# Altium footprint library common_pcblib.PcbLib: 54 footprints (part 3 of 4)
Each footprint in its own frame and in the unit in brackets; x right, y up, seen from the top. Pads: shape width x height; smd on the part's side, far side on the other; paste and mask are expansions set on the pad; w line width, h text height; cw(c..) or ccw(c..) is an arc to the next point about the centre after c.
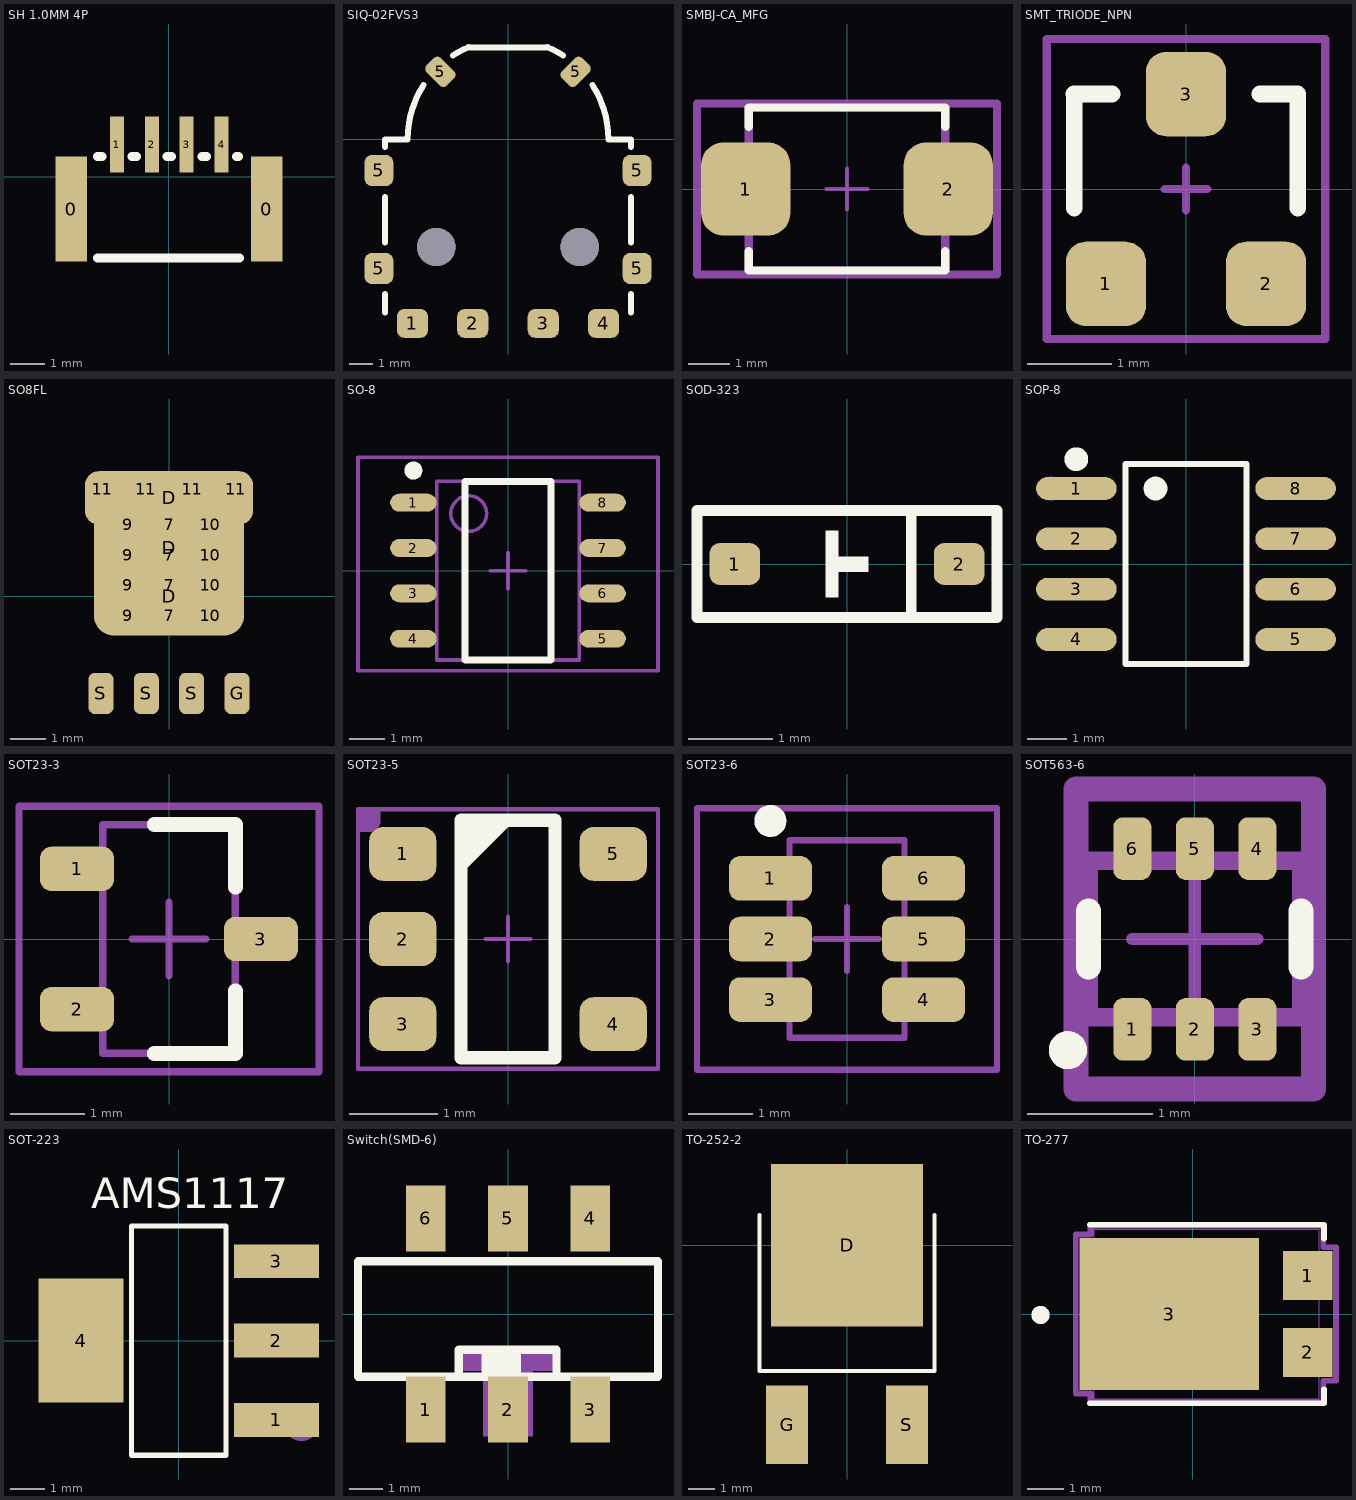
[diagram p2: the footprints below, top view; thin cyan lines are the x and y axes]

## SH 1.0MM 4P [mm] "4P立贴"
pads (6):
  rect 0.9x3 smd: 0(-2.8,-0.924) 0(2.8,-0.924)
  rect 0.4x1.6 smd: 1(-1.493,0.924) 2(-0.493,0.924) 3(0.507,0.924) 4(1.507,0.924)
Top Overlay:
  lines w0.254: -2.05,-2.324 2.03,-2.324 ; -2.05,0.586 -1.924,0.586 ; -1.062,0.586 -0.924,0.586 ; -0.062,0.586 0.076,0.586 ; 0.938,0.586 1.076,0.586 ; 1.938,0.586 2,0.586
3D body "User Library-插座1.0mm 4P.step": height 4.25, standoff 0, extent -3,-2.413 3,1.187

## SIQ-02FVS3 [mm]
pads (10):
  rrect50% 1.3x1.2 smd: 1(-4,-7.7) 2(-1.475,-7.7) 3(1.475,-7.7) 4(4,-7.7)
  rrect50% 1.2x1.3 smd: 5(-5.4,-5.4) 5(-5.4,-1.3) 5(5.4,-5.4) 5(5.4,-1.3)
  rrect50% 0.85x1.2 smd rot 45: 5(-2.828,2.828)
  rrect50% 0.85x1.2 smd rot 135: 5(2.828,2.828)
via 3,-4.5 diameter 1.6 hole 1.6
via -3,-4.5 diameter 1.6 hole 1.6
Top Overlay:
  lines w0.254: -5.15,-7.25 -5.15,-6.477 ; -5.15,-4.318 -5.15,-2.402 ; -5.15,-0.324 -5.15,0 -4.2,0 cw(c0,0) -3.533,2.271 ; -2.298,3.515 cw(c0,0) -1.655,3.86 ; -1.655,3.85 1.655,3.85 ; 1.655,3.86 cw(c0,0) 2.298,3.515 ; 3.533,2.271 cw(c0,0) 4.2,0 5.15,0 5.15,-0.324 ; 5.15,-7.25 5.15,-6.477 ; 5.15,-4.318 5.15,-2.402
3D body "RE.step": height 4.06, standoff -0.44, extent -7.199,-7.5 7.199,7.25

## SMBJ-CA_MFG [mm]
pads (2):
  rrect50% 2.16x2.26 smd paste+0 mask+0: 1(-2.45,0) 2(2.45,0)
Top Overlay:
  lines w0.2: -2.375,-1.505 -2.375,-1.97 2.375,-1.97 2.375,-1.505 ; -2.375,1.505 -2.375,1.97 2.375,1.97 2.375,1.505
Mechanical 10:
  lines w0.2: -3.63,-2.07 -3.63,2.07 3.63,2.07 3.63,-2.07 -3.63,-2.07
Mechanical 12:
  lines w0.2: -2.375,-1.97 -2.375,1.97 2.375,1.97 2.375,-1.97 -2.375,-1.97
Mechanical 15:
  lines w0.1: -0.5,0 0.5,0 ; 0,-0.5 0,0.5
  lines w0.2: -3.63,-2.07 -3.63,2.07 3.63,2.07 3.63,-2.07 -3.63,-2.07
3D body "Diode_Littelfuse_Inc_SMBJ28CA_eec.STEP": height 2.62, standoff 0, extent -2.7,-1.81 2.7,1.81

## SMT_TRIODE_NPN [mm]
pads (3):
  rrect50% 0.95x1 smd: 1(-0.95,-1.125) 2(0.95,-1.125) 3(0,1.125)
Top Overlay:
  lines w0.2: -1.328,1.125 -0.875,1.125 ; -1.325,-0.225 -1.325,1.125 ; 0.875,1.125 1.325,1.125 1.325,-0.225
Mechanical 15:
  lines w0.1: -0.254,0 0.254,0 ; 0,-0.254 0,0.254 ; -1.651,-1.778 1.651,-1.778 1.651,1.778 -1.651,1.778 -1.651,-1.778
3D body "User Library-SOT23-3.step": height 1.3, standoff 0, extent -1.448,-1.397 1.452,1.403

## SO8FL [mm]
pads (23):
  rect 0.9x0.6 on Top Paste: 7(0,-0.55) 7(0,0.3) 7(0,1.15) 7(0,2) 9(-1.15,-0.55) 9(-1.15,0.3) 9(-1.15,1.15) 9(-1.15,2) 10(1.15,-0.55) 10(1.15,0.3) 10(1.15,1.15) 10(1.15,2)
  rect 0.6x0.9 on Top Paste: 11(-1.875,3) 11(-0.65,3) 11(0.65,3) 11(1.875,3)
  rrect50% 4.2x2.2 smd paste-10 mask+0.075: D(0,0)
  rect 4.2x2.2 smd paste-10 mask+0.075: D(0,1.35)
  rrect50% 4.7x1.5 smd paste-10 mask+0.075: D(0,2.75)
  rrect50% 0.7x1.15 smd paste-0.05 mask+0.075: G(1.905,-2.725) S(-1.905,-2.725) S(-0.635,-2.725) S(0.635,-2.725)
3D body "User Library-DFN5x6_SO8FL.STEP": height 1.13, standoff 0, extent -2.575,-2.95 2.575,3.2

## SO-8 [mm]
pads (8):
  oval 1.3x0.5 smd: 1(-2.65,1.905) 2(-2.65,0.635) 3(-2.65,-0.635) 4(-2.65,-1.905) 5(2.65,-1.905) 6(2.65,-0.635) 7(2.65,0.635) 8(2.65,1.905)
Top Overlay:
  circle w0.25: c-2.65,2.805 r0.125
  lines w0.2: -1.2,-2.5 -1.2,2.5 1.2,2.5 1.2,-2.5 -1.2,-2.5
Mechanical 13:
  circle w0.1: c-1.1,1.6 r0.5
  lines w0.1: -2,-2.5 -2,2.5 2,2.5 2,-2.5 -2,-2.5
Mechanical 15:
  lines w0.1: -0.5,0 0.5,0 ; 0,-0.5 0,0.5 ; -4.2,-2.8 -4.2,3.175 4.2,3.175 4.2,-2.8 -4.2,-2.8
3D body "SW3DPS-SO-8-DEFAULT.STEP": height 1.45, standoff 0, extent -2.889,-2.439 2.889,2.464

## SOD-323 [mm]
pads (2):
  rrect50% 0.6x0.5 smd: 1(-1.329,0) 2(1.329,0)
Top Overlay:
  region: -0.254,0.394 -0.102,0.394 -0.102,0.089 0.254,0.089 0.254,-0.089 -0.102,-0.089 -0.102,-0.394 -0.254,-0.394
  lines w0.127: 0.762,-0.635 0.762,0.635 ; -1.778,-0.635 1.778,-0.635 1.778,0.635 -1.778,0.635 -1.778,-0.635
3D body "SW3dPS-SOD-323.STEP": height 1.15, standoff 0.05, extent -1.3,-0.675 1.3,0.675

## SOP-8 [mm]
pads (8):
  oval 2.036x0.574 smd: 1(-2.768,1.905) 2(-2.768,0.635) 3(-2.768,-0.635) 4(-2.768,-1.905) 5(2.768,-1.905) 6(2.768,-0.635) 7(2.768,0.635) 8(2.768,1.905)
Top Overlay:
  circle w0.3: c-2.768,2.644 r0.15
  circle w0.3: c-0.769,1.905 r0.15
  lines w0.152: -1.521,-2.526 -1.521,2.526 1.521,2.526 1.521,-2.526 -1.521,-2.526
Mechanical 15:
  circle w0.3: c-3.398,1.905 r0.15
3D body "User Library-HSOP8-1.STEP": height 1.74, standoff -0.01, extent -3.1,-2.54 3.1,2.46

## SOT23-3 [mm]
pads (3):
  rrect50% 1x0.6 smd: 1(-1.246,0.95) 2(-1.246,-0.95) 3(1.246,0)
Top Overlay:
  lines w0.2: -0.2,-1.55 0.9,-1.55 0.9,-0.7 ; -0.2,1.55 0.9,1.55 0.9,0.7
Mechanical 13:
  lines w0.1: -0.9,-1.55 0.9,-1.55 0.9,1.55 -0.9,1.55 -0.9,-1.55
Mechanical 15:
  lines w0.1: -0.5,0 0.5,0 ; 0,-0.5 0,0.5 ; -2.032,-1.8 2.032,-1.8 2.032,1.8 -2.032,1.8 -2.032,-1.8
3D body "SOT-23-3.stp": height 1.2, standoff 0, extent -1.298,-1.45 1.502,1.45

## SOT23-5 [mil]
pads (5):
  rrect50% 30x24 smd: 1(-47,38) 2(-47,0) 3(-47,-38) 4(47,-38) 5(47,38)
Top Overlay:
  region: -21,53 3,53 -21,29
  lines w6: -21,-53 -21,53 21,53 21,-53 -21,-53
Mechanical 13:
  lines w2: -10,0 10,0 ; 0,-10 0,10
Mechanical 14:
  region: -67,58 -57,58 -57,53 -57,52.01 -57.76,50.17 -59.17,48.76 -61.01,48 -62,48 -67,48
  lines w2: -67,-58 67,-58 67,58 -67,58 -67,-58
3D body "User Library-SOT23-5-2.STEP": height 57.09, standoff 0, extent -55.11,-57.08 55.12,57.09

## SOT23-6 [mm]
pads (6):
  rrect50% 1.3x0.7 smd: 1(-1.2,0.95) 2(-1.2,0) 3(-1.2,-0.95) 4(1.2,-0.95) 5(1.2,0) 6(1.2,0.95)
Top Overlay:
  circle w0.25: c-1.2,1.85 r0.125
Mechanical 13:
  lines w0.1: -0.9,-1.55 0.9,-1.55 0.9,1.55 -0.9,1.55 -0.9,-1.55
Mechanical 15:
  lines w0.1: -0.5,0 0.5,0 ; 0,-0.5 0,0.5 ; -2.35,-2.05 2.35,-2.05 2.35,2.05 -2.35,2.05 -2.35,-2.05
3D body "User Library-SOT23-6-2.step": height 1.45, standoff 0, extent -1.4,-1.45 1.4,1.45

## SOT563-6 [mm]
pads (6):
  rrect50% 0.305x0.5 smd paste+0 mask+0: 1(-0.5,-0.723) 2(0,-0.723) 3(0.5,-0.723) 4(0.5,0.723) 5(0,0.723) 6(-0.5,0.723)
Top Overlay:
  circle w0.152: c-1.016,-0.889 r0.076
  lines w0.2: -0.85,-0.225 -0.85,0.225 ; 0.85,-0.225 0.85,0.225
Mechanical 10:
  lines w0.2: -0.95,-1.2 0.95,-1.2 0.95,1.2 -0.95,1.2 -0.95,-1.2
Mechanical 12:
  lines w0.15: -0.85,-0.625 0.85,-0.625 0.85,0.625 -0.85,0.625 -0.85,-0.625
Mechanical 15:
  lines w0.1: -0.5,0 0.5,0 ; 0,-0.5 0,0.5
  lines w0.2: -0.95,-1.2 0.95,-1.2 0.95,1.2 -0.95,1.2 -0.95,-1.2
3D body "Trans_Diodes_BC847BVC-7_eec.STEP": height 0.6, standoff 0, extent -0.8,-0.8 0.8,0.8

## SOT-223 [mm] "AMS1117"
pads (4):
  rect 2.47x0.98 smd: 1(2.835,-2.3) 2(2.835,0) 3(2.835,2.3)
  rect 2.47x3.6 smd: 4(-2.835,0)
Top Overlay:
  lines w0.152: -1.371,-3.326 -1.371,3.326 1.371,3.326 1.371,-3.326 -1.371,-3.326
  text "AMS1117" at -2.54,3.556 h1.52
Mechanical 15:
  circle w0.5: c3.556,-2.413 r0.25
3D body "lm7805mpx_nopb.stp": height 1.66, standoff 0, extent -3.5,-3.302 3.5,3.198

## Switch(SMD-6) [mm]
pads (6):
  rect 1.2x2 smd: 1(-2.5,-2.9) 2(0,-2.9) 3(2.5,-2.9) 4(2.5,2.9) 5(0,2.9) 6(-2.5,2.9)
Top Overlay:
  lines w0.254: -0.67,-1.795 -0.67,-1.1 -0.64,-1.1 ; -0.06,-1.58 -0.06,-1.6 -0.41,-1.6 -0.41,-1.46 -0.39,-1.46 -0.39,-1.44 0.09,-1.44 0.09,-1.72 0.13,-1.72 -0.51,-1.72 -0.51,-1.24 -0.49,-1.24 -0.49,-1.23 0.26,-1.23 0.26,-1.78 ; -4.55,-1.9 4.55,-1.9 4.55,1.6 -4.55,1.6 -4.55,-1.9 ; -1.49,-1.9 1.47,-1.9 1.47,-1.08 -1.49,-1.08 -1.49,-1.9
Mechanical 15:
  region: -0.742,-3.709 -0.755,-3.714 -0.755,-1.721 -1.575,-1.715 -1.575,-1.042 1.515,-1.042 1.515,-1.724 0.753,-1.724 0.753,-3.709
3D body "User Library-SlideSwitchMSK08-2.step": height 3.6, standoff -0.5, extent -3.6,-3.177 3.6,2.923

## TO-252-2 [mm]
pads (3):
  rect 5.8x6.2 smd: D(0,0)
  rect 1.6x3 smd: G(-2.285,-6.848) S(2.285,-6.848)
Top Overlay:
  lines w0.152: -3.346,1.161 -3.346,-4.807 3.346,-4.807 3.346,1.161
Mechanical 15:
  circle w0.6: c-2.413,-7.361 r0.3
3D body "DPAK-4_6P22X6P73_ONS.step": height 2.39, standoff -0.05, extent -3.365,-8.372 3.367,3.122

## TO-277 [mil] "贴片二极管"
pads (3):
  rect 53x53 smd paste+0 mask+0: 1(123.5,41.34) 2(123.5,-41.34)
  rect 193x163 smd paste+0 mask+0: 3(-25.5,0)
Top Overlay:
  circle w9.84: c-163.78,-1.06 r4.92
  lines w6: -111.06,-96 141.06,-96 141.06,-80.94 ; -111.06,96 141.06,96 141.06,80.94
Mechanical 13:
  lines w1: -106.06,-91 -106.06,91 136.06,91 136.06,-91 -106.06,-91
Mechanical 15:
  lines w6: -126,-85.5 -126,85.5 -110.06,85.5 -110.06,95 140.06,95 140.06,71.84 154,71.84 154,-71.84 140.06,-71.84 140.06,-95 -110.06,-95 -110.06,-85.5 -126,-85.5
3D body "SMD_1060V_ONS.step": height 49.09, standoff 0, extent -115.98,-90.98 145.98,90.98